# Altium footprint library socket_Arduino.PcbLib: 1 footprints
Each footprint in its own frame and in the unit in brackets; x right, y up, seen from the top. Pads: shape width x height; smd on the part's side, far side on the other; paste and mask are expansions set on the pad; w line width, h text height; cw(c..) or ccw(c..) is an arc to the next point about the centre after c.
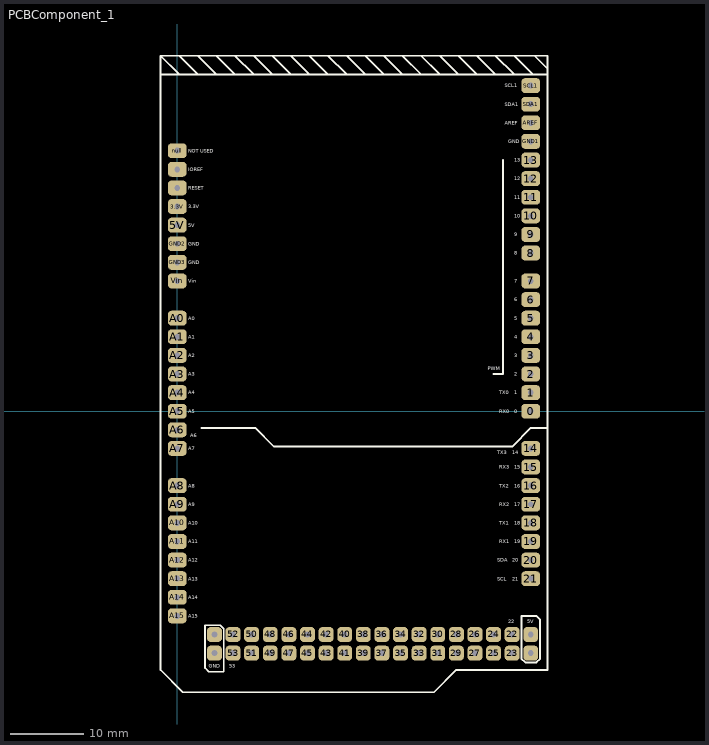
[diagram p0: the footprint, top view; thin cyan lines are the x and y axes]

## PCBComponent_1 [mil]
pads (86):
  rrect50% 100x80 hole 32: 0(1900,0) 1(1900,100) 2(1900,200) 3(1900,300) 3.3V(0,1100) 4(1900,400) 5(1900,500) 5V(0,1000) 6(1900,600) 7(1900,700) 8(1900,850) 9(1900,950) 10(1900,1050) 11(1900,1150) 12(1900,1250) 13(1900,1350) 14(1900,-200) 15(1900,-300) 16(1900,-400) 17(1900,-500) 18(1900,-600) 19(1900,-700) 20(1900,-800) 21(1900,-900) A0(0,500) A1(0,400) A2(0,300) A3(0,200) A4(0,100) A5(0,0) A6(0,-100) A7(0,-200) A8(0,-400) A9(0,-500) A10(0,-600) A11(0,-700) A12(0,-800) A13(0,-900) A14(0,-1000) A15(0,-1100) AREF(1900,1550) GND1(1900,1450) GND2(0,900) GND3(0,800) IOREF(0,1300) null(0,1400) RESET(0,1200) SCL1(1900,1750) SDA1(1900,1650) Vin(0,700)
  rrect50% 80x80 hole 32: 5V_a(1900,-1200) 5V_b(1900,-1300) 22(1800,-1200) 23(1800,-1300) 24(1700,-1200) 25(1700,-1300) 26(1600,-1200) 27(1600,-1300) 28(1500,-1200) 29(1500,-1300) 30(1400,-1200) 31(1400,-1300) 32(1300,-1200) 33(1300,-1300) 34(1200,-1200) 35(1200,-1300) 36(1100,-1200) 37(1100,-1300) 38(1000,-1200) 39(1000,-1300) 40(900,-1200) 41(900,-1300) 42(800,-1200) 43(800,-1300) 44(700,-1200) 45(700,-1300) 46(600,-1200) 47(600,-1300) 48(500,-1200) 49(500,-1300) 50(400,-1200) 51(400,-1300) 52(300,-1200) 53(300,-1300) GND4(200,-1200) GND5(200,-1300)
Top Overlay:
  lines w10: -90,1810 1990,1810 ; 130,-90 420,-90 520,-190 1800,-190 1900,-90 1990,-90 ; 210,1810 110,1910 10,1910 110,1810 10,1810 -90,1910 ; 210,1910 310,1810 ; 310,1910 410,1810 ; 410,1910 510,1810 ; 510,1910 610,1810 ; 610,1910 710,1810 ; 710,1910 810,1810 ; 810,1910 910,1810 ; 910,1910 1010,1810 ; 1010,1910 1110,1810 ; 1110,1910 1210,1810 ; 1210,1910 1310,1810 ; 1310,1910 1410,1810 ; 1410,1910 1510,1810 ; 1510,1910 1610,1810 ; 1610,1910 1710,1810 ; 1700,200 1750,200 1750,1350 ; 1710,1910 1810,1810 ; 1810,1910 1910,1810 ; 1910,1910 1920,1910 1990,1840 ; -90,1910 -90,-310 -90,-1390 30,-1510 1380,-1510 1500,-1390 1990,-1390 1990,-90 ; -90,1910 1990,1910 1990,-90 ; 150,-1380 170,-1400 250,-1400 250,-1170 230,-1150 150,-1150 150,-1380 ; 1850,-1330 1850,-1100 1930,-1100 1950,-1120 1950,-1330 1930,-1350 1870,-1350 1850,-1330
  text "NOT USED" at 60,1390 h20
  text "AREF" at 1760,1540 h20
  text "GND" at 1780,1440 h20
  text "12" at 1810,1240 h20
  text "11" at 1810,1140 h20
  text "13" at 1810,1340 h20
  text "10" at 1810,1040 h20
  text "9" at 1810,940 h20
  text "8" at 1810,840 h20
  text "7" at 1810,690 h20
  text "6" at 1810,590 h20
  text "5" at 1810,490 h20
  text "4" at 1810,390 h20
  text "3" at 1810,290 h20
  text "2" at 1810,190 h20
  text "1" at 1810,90 h20
  text "0" at 1810,-10 h20
  text "RESET" at 60,1190 h20
  text "3.3V" at 60,1090 h20
  text "5V" at 60,990 h20
  text "GND" at 60,890 h20
  text "GND" at 60,790 h20
  text "Vin" at 60,690 h20
  text "A0" at 60,490 h20
  text "A1" at 60,390 h20
  text "A2" at 60,290 h20
  text "A3" at 60,190 h20
  text "A4" at 60,90 h20
  text "A5" at 60,-10 h20
  text "IOREF" at 60,1290 h20
  text "A7" at 60,-210 h20
  text "A8" at 60,-410 h20
  text "A9" at 60,-510 h20
  text "A10" at 60,-610 h20
  text "A11" at 60,-710 h20
  text "A12" at 60,-810 h20
  text "A13" at 60,-910 h20
  text "A14" at 60,-1010 h20
  text "A15" at 60,-1110 h20
  text "14" at 1800,-230 h20
  text "15" at 1810,-310 h20
  text "16" at 1810,-410 h20
  text "17" at 1810,-510 h20
  text "18" at 1810,-610 h20
  text "19" at 1810,-710 h20
  text "20" at 1800,-810 h20
  text "21" at 1800,-910 h20
  text "TX1" at 1730,-610 h20
  text "TX2" at 1730,-410 h20
  text "TX3" at 1720,-230 h20
  text "RX1" at 1730,-710 h20
  text "RX2" at 1730,-510 h20
  text "RX3" at 1730,-310 h20
  text "SDA" at 1720,-810 h20
  text "SCL" at 1720,-910 h20
  text "22" at 1780,-1140 h20
  text "53" at 280,-1380 h20
  text "GND" at 170,-1380 h20
  text "5V" at 1880,-1140 h20
  text "TX0" at 1730,90 h20
  text "RX0" at 1730,-10 h20
  text "PWM" at 1670,220 h20
  text "A6" at 70,-140 h20
  text "SDA1" at 1760,1640 h20
  text "SCL1" at 1760,1740 h20
3D body: height 103.11, standoff -351.22, extent 1850,1600 1950,1800
3D body: height -15.43, standoff -590.24, extent -90,-1500 2010,2574.01
3D body: height 103.11, standoff -351.22, extent -50,-250 50,550
3D body: height 103.11, standoff -351.22, extent -50,-1150 50,-350
3D body: height 103.11, standoff -351.22, extent 1850,-949.99 1950,-149.99
3D body: height 103.11, standoff -351.22, extent 1850,-50 1950,750
3D body: height 103.11, standoff -351.22, extent 1850,800 1950,1600
3D body: height 103.11, standoff -351.22, extent -50,650 50,850
3D body: height 103.11, standoff -351.22, extent -50,850 50,1350
3D body: height 103.11, standoff -351.22, extent 950,-1250 1950,-1150
3D body: height 103.11, standoff -351.22, extent 150,-1350 1150,-1250
3D body: height 103.11, standoff -351.22, extent 150,-1250 950,-1150
3D body: height 103.11, standoff -351.22, extent 1150.01,-1349.99 1950.01,-1249.99